# Altium schematic symbol library LATTICEPLDS_Library.SchLib: 291 symbols (part 5 of 32) (continued)
## LCMXO3L-640-MG121
designator U?
SWAP_INFO: (S1+S2+S3+S4+S5); SPLIT_INST: TRUE
part A pins: A2 PT17A (io), A3 PT16A (io), A4 PT15A (io), A5 PT12C/SCL_PCLK0_0 (io), A6 PT12B/PCLKC0_1 (io), A7 PT11A (io), A8 PT10D/TDI (io), A9 PT10A (io), A10 PT9A (io), B2 PT17B (io), B3 PT16B (io), B4 PT15B (io), B5 PT12D/SDA/PCLKC0_O (io), B6 PT12A/PCLKTO_1 (io), B7 PT11B (io), B8 PT10B (io), B9 PT9B (io), C3 PT17C/INITN (io), C4 PT15D/PROGRAMN (io), C5 PT15C/JTAGENB (io), C6 PT11D/TMS (io), C7 PT11C/TCL (io), C8 PT9C (io), D4 PT17D/DONE (io), D6 VCCIO0 (power), D7 PT10C/TDO (io)
part B pins: B1 PR2C (io), C1 PR2D (io), C2 PR2A (io), D1 PR3B (io), D2 PR3A (io), D3 PR2B (io), E1 PR4D (io), E2 PR4C (io), E3 PR4B (io), E4 PR4A (io), F1 PR5D/PCLKC1_0 (io), F2 PR5C/PCLKT1_0 (io), F3 PR5A (io), F4 PR5B (io), G1 PR8A (io), G2 PR8B (io), G3 PR8C (io), G4 PR8D (io), H1 PR9A (io), H2 PR9B (io), H3 PR9C (io), H4 PR9D (io), H5 VCCIO1 (power), J1 PR10A (io), J2 PR10C (io), J3 PR10D (io), K1 PR10B (io)
part C pins: H6 VCCIO2 (power), H7 PB6D/SO/SPISO (io), H9 PB4A (io), J4 PB18D (io), J5 PB18C (io), J6 PB15C (io), J7 PB11D (io), J8 PB6C/MCLK/CCLK (io), J9 PB4B (io), K2 PB20D/SI/SISPI (io), K3 PB20B (io), K4 PB18B (io), K5 PB15B (io), K6 PB11B/PCLKC2_1 (io), K7 PB9B/PCLKC2_0 (io), K8 PB9C (io), K9 PB6A (io), K10 PB4C/CSSPIN (io), L2 PB20C/SN (io), L3 PB20A (io), L4 PB18A (io), L5 PB15A (io), L6 PB11A/PCLKT2_1 (io), L7 PB9A/PCLKT2_0 (io), L8 PB9D (io), L9 PB6B (io), L10 PB4D (io)
part D pins: B10 PL2C/L_GPLLT_IN (io), B11 PL2D/L_GPLLC_IN (io), C9 PL2A/L_GPLLT_FB (io), C10 PL3A/PCLKT3_2 (io), C11 PL3B/PCLKC3_2 (io), D8 VCCIO3 (power), D9 PL3C (io), D10 PL4A (io), D11 PL4B (io), E8 PL2B/L_GPLLC_FB (io), E9 PL3D (io), E10 PL4C (io), E11 PL4D (io), F8 VCCIO3 (power), F9 PL5C (io), F10 PL5B/PCLKC3_1 (io), F11 PL5A/PCLKT3_1 (io), G8 PL8D (io), G9 PL8C (io), G10 PL8B (io), G11 PL8A (io), H8 VCCIO3 (power), H10 PL9B/PCLKC3_0 (io), H11 PL9A/PCLKT3_0 (io), J10 PL10D (io), J11 PL10A (io), K11 PL10C (io)
part E pins: A1 GND (power), A11 GND (power), D5 VCC (power), E5 VCC (power), E6 GND (power), E7 GND (power), F5 GND (power), F6 GND (power), F7 VCC (power), G5 GND (power), G6 GND (power), G7 VCC (power), L1 GND (power), L11 GND (power)
part A text: BANK0
part B text: BANK1
part C text: BANK2
part D text: BANK3

## LCMXO3L-1300-MG121
designator U?
SWAP_INFO: (S1+S2+S3+S4+S5); SPLIT_INST: TRUE
part A pins: A2 PT17A (io), A3 PT16A (io), A4 PT15A (io), A5 PT12C/SCL/PCLKTO_0 (io), A6 PT12B/PCLKC0_1 (io), A7 PT11A (io), A8 PT10D/TDI (io), A9 PT10A (io), A10 PT9A (io), B2 PT17B (io), B3 PT16B (io), B4 PT15B (io), B5 PT12D/SDA/PCLKC0_0 (io), B6 PT12A/PCLKTO_1 (io), B7 PT11B (io), B8 PT10B (io), B9 PT9B (io), C3 PT17C/INITN (io), C4 PT15D/PROGRAMN (io), C5 PT15C/JTAGENB (io), C6 PT11D/TMS (io), C7 PT11C/TCK (io), C8 PT9C (io), D4 PT17D/DONE (io), D6 VCCIO0 (power), D7 PT10C/TDO (io)
part B pins: B1 PR2C (io), C1 PR2D (io), C2 PR2A (io), D1 PR3B (io), D2 PR3A (io), D3 PR2B (io), E1 PR4D (io), E2 PR4C (io), E3 PR4B (io), E4 PR4A (io), F1 PR5D/PCLKC1_0 (io), F2 PR5C/PCLKT1_0 (io), F3 PR5A (io), F4 PR5B (io), G1 PR8A (io), G2 PR8B (io), G3 PR8C (io), G4 PR8D (io), H1 PR9A (io), H2 PR9B (io), H3 PR9C (io), H4 PR9D (io), H5 VCCIO1 (power), J1 PR10A (io), J2 PR10C (io), J3 PR10D (io), K1 PR10B (io)
part C pins: H6 VCCIO2 (power), H7 PB6D/SO/SPISO (io), H9 PB4A (io), J4 PB18D (io), J5 PB18C (io), J6 PB15C (io), J7 PB11D (io), J8 PB6C/MCLK/CCLK (io), J9 PB4B (io), K2 PB20D/SI/SISPI (io), K3 PB20B (io), K4 PB18B (io), K5 PB15B (io), K6 PB11B/PCLKC2_1 (io), K7 PB9B/PCLKC2_0 (io), K8 PB9C (io), K9 PB6A (io), K10 PB4C/CSSPIN (io), L2 PB20C/SN (io), L3 PB20A (io), L4 PB18A (io), L5 PB15A (io), L6 PB11A/PCLKT2_1 (io), L7 PB9A/PCLKT2_0 (io), L8 PB9D (io), L9 PB6B (io), L10 PB4D (io)
part D pins: B10 PL2C/L_GPLLT_IN (io), B11 PL2D/L_GPLLC_IN (io), C9 PL2A/L_GPLLT_FB (io), C10 PL3A/PCLKT3_2 (io), C11 PL3B/PCLKC3_2 (io), D8 VCCIO3 (power), D9 PL3C (io), D10 PL4A (io), D11 PL4B (io), E8 PL2B/L_GPLLC_FB (io), E9 PL3D (io), E10 PL4C (io), E11 PL4D (io), F8 VCCIO3 (power), F9 PL5C (io), F10 PL5B/PCLKC3_1 (io), F11 PL5A/PCLKT3_1 (io), G8 PL8D (io), G9 PL8C (io), G10 PL8B (io), G11 PL8A (io), H8 VCCIO3 (power), H10 PL9B/PCLKC3_0 (io), H11 PL9A/PCLKT3_0 (io), J10 PL10D (io), J11 PL10A (io), K11 PL10C (io)
part E pins: A1 GND (power), A11 GND (power), D5 VCC (power), E5 VCC (power), E6 GND (power), E7 GND (power), F5 GND (power), F6 GND (power), F7 VCC (power), G5 GND (power), G6 GND (power), G7 VCC (power), L1 GND (power), L11 GND (power)
part A text: BANK0
part B text: BANK1
part C text: BANK2
part D text: BANK3

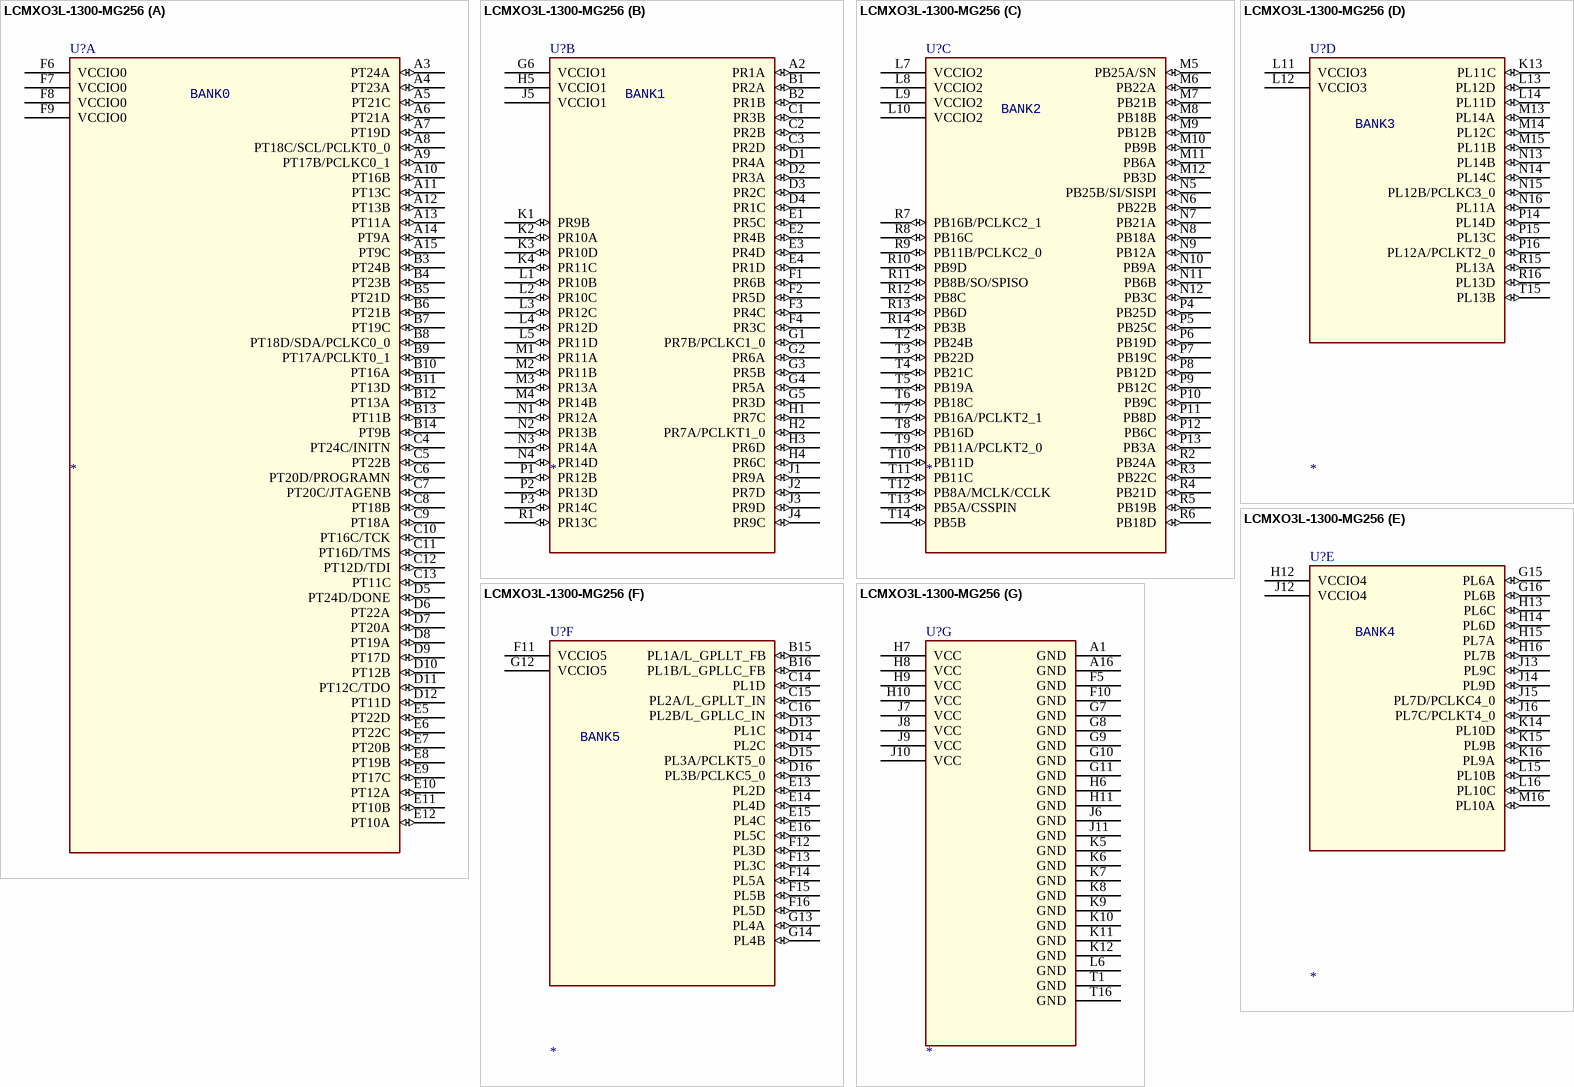
[diagram p52: symbol LCMXO3L-1300-MG256]

## LCMXO3L-1300-MG256
designator U?
SWAP_INFO: (S1+S2+S3+S4+S5+S6+S7); SPLIT_INST: TRUE
part A pins: A3 PT24A (io), A4 PT23A (io), A5 PT21C (io), A6 PT21A (io), A7 PT19D (io), A8 PT18C/SCL/PCLKT0_0 (io), A9 PT17B/PCLKC0_1 (io), A10 PT16B (io), A11 PT13C (io), A12 PT13B (io), A13 PT11A (io), A14 PT9A (io), A15 PT9C (io), B3 PT24B (io), B4 PT23B (io), B5 PT21D (io), B6 PT21B (io), B7 PT19C (io), B8 PT18D/SDA/PCLKC0_0 (io), B9 PT17A/PCLKT0_1 (io), B10 PT16A (io), B11 PT13D (io), B12 PT13A (io), B13 PT11B (io), B14 PT9B (io), C4 PT24C/INITN (io), C5 PT22B (io), C6 PT20D/PROGRAMN (io), C7 PT20C/JTAGENB (io), C8 PT18B (io), C9 PT18A (io), C10 PT16C/TCK (io), C11 PT16D/TMS (io), C12 PT12D/TDI (io), C13 PT11C (io), D5 PT24D/DONE (io), D6 PT22A (io), D7 PT20A (io), D8 PT19A (io), D9 PT17D (io), D10 PT12B (io), D11 PT12C/TDO (io), D12 PT11D (io), E5 PT22D (io), E6 PT22C (io), E7 PT20B (io), E8 PT19B (io), E9 PT17C (io), E10 PT12A (io), E11 PT10B (io), E12 PT10A (io), F6 VCCIO0 (power), F7 VCCIO0 (power), F8 VCCIO0 (power), F9 VCCIO0 (power)
part B pins: A2 PR1A (io), B1 PR2A (io), B2 PR1B (io), C1 PR3B (io), C2 PR2B (io), C3 PR2D (io), D1 PR4A (io), D2 PR3A (io), D3 PR2C (io), D4 PR1C (io), E1 PR5C (io), E2 PR4B (io), E3 PR4D (io), E4 PR1D (io), F1 PR6B (io), F2 PR5D (io), F3 PR4C (io), F4 PR3C (io), G1 PR7B/PCLKC1_0 (io), G2 PR6A (io), G3 PR5B (io), G4 PR5A (io), G5 PR3D (io), G6 VCCIO1 (power), H1 PR7C (io), H2 PR7A/PCLKT1_0 (io), H3 PR6D (io), H4 PR6C (io), H5 VCCIO1 (power), J1 PR9A (io), J2 PR7D (io), J3 PR9D (io), J4 PR9C (io), J5 VCCIO1 (power), K1 PR9B (io), K2 PR10A (io), K3 PR10D (io), K4 PR11C (io), L1 PR10B (io), L2 PR10C (io), L3 PR12C (io), L4 PR12D (io), L5 PR11D (io), M1 PR11A (io), M2 PR11B (io), M3 PR13A (io), M4 PR14B (io), N1 PR12A (io), N2 PR13B (io), N3 PR14A (io), N4 PR14D (io), P1 PR12B (io), P2 PR13D (io), P3 PR14C (io), R1 PR13C (io)
part C pins: L7 VCCIO2 (power), L8 VCCIO2 (power), L9 VCCIO2 (power), L10 VCCIO2 (power), M5 PB25A/SN (io), M6 PB22A (io), M7 PB21B (io), M8 PB18B (io), M9 PB12B (io), M10 PB9B (io), M11 PB6A (io), M12 PB3D (io), N5 PB25B/SI/SISPI (io), N6 PB22B (io), N7 PB21A (io), N8 PB18A (io), N9 PB12A (io), N10 PB9A (io), N11 PB6B (io), N12 PB3C (io), P4 PB25D (io), P5 PB25C (io), P6 PB19D (io), P7 PB19C (io), P8 PB12D (io), P9 PB12C (io), P10 PB9C (io), P11 PB8D (io), P12 PB6C (io), P13 PB3A (io), R2 PB24A (io), R3 PB22C (io), R4 PB21D (io), R5 PB19B (io), R6 PB18D (io), R7 PB16B/PCLKC2_1 (io), R8 PB16C (io), R9 PB11B/PCLKC2_0 (io), R10 PB9D (io), R11 PB8B/SO/SPISO (io), R12 PB8C (io), R13 PB6D (io), R14 PB3B (io), T2 PB24B (io), T3 PB22D (io), T4 PB21C (io), T5 PB19A (io), T6 PB18C (io), T7 PB16A/PCLKT2_1 (io), T8 PB16D (io), T9 PB11A/PCLKT2_0 (io), T10 PB11D (io), T11 PB11C (io), T12 PB8A/MCLK/CCLK (io), T13 PB5A/CSSPIN (io), T14 PB5B (io)
part D pins: K13 PL11C (io), L11 VCCIO3 (power), L12 VCCIO3 (power), L13 PL12D (io), L14 PL11D (io), M13 PL14A (io), M14 PL12C (io), M15 PL11B (io), N13 PL14B (io), N14 PL14C (io), N15 PL12B/PCLKC3_0 (io), N16 PL11A (io), P14 PL14D (io), P15 PL13C (io), P16 PL12A/PCLKT2_0 (io), R15 PL13A (io), R16 PL13D (io), T15 PL13B (io)
part E pins: G15 PL6A (io), G16 PL6B (io), H12 VCCIO4 (power), H13 PL6C (io), H14 PL6D (io), H15 PL7A (io), H16 PL7B (io), J12 VCCIO4 (power), J13 PL9C (io), J14 PL9D (io), J15 PL7D/PCLKC4_0 (io), J16 PL7C/PCLKT4_0 (io), K14 PL10D (io), K15 PL9B (io), K16 PL9A (io), L15 PL10B (io), L16 PL10C (io), M16 PL10A (io)
part F pins: B15 PL1A/L_GPLLT_FB (io), B16 PL1B/L_GPLLC_FB (io), C14 PL1D (io), C15 PL2A/L_GPLLT_IN (io), C16 PL2B/L_GPLLC_IN (io), D13 PL1C (io), D14 PL2C (io), D15 PL3A/PCLKT5_0 (io), D16 PL3B/PCLKC5_0 (io), E13 PL2D (io), E14 PL4D (io), E15 PL4C (io), E16 PL5C (io), F11 VCCIO5 (power), F12 PL3D (io), F13 PL3C (io), F14 PL5A (io), F15 PL5B (io), F16 PL5D (io), G12 VCCIO5 (power), G13 PL4A (io), G14 PL4B (io)
part G pins: A1 GND (power), A16 GND (power), F5 GND (power), F10 GND (power), G7 GND (power), G8 GND (power), G9 GND (power), G10 GND (power), G11 GND (power), H6 GND (power), H7 VCC (power), H8 VCC (power), H9 VCC (power), H10 VCC (power), H11 GND (power), J6 GND (power), J7 VCC (power), J8 VCC (power), J9 VCC (power), J10 VCC (power), J11 GND (power), K5 GND (power), K6 GND (power), K7 GND (power), K8 GND (power), K9 GND (power), K10 GND (power), K11 GND (power), K12 GND (power), L6 GND (power), T1 GND (power), T16 GND (power)
part A text: BANK0
part B text: BANK1
part C text: BANK2
part D text: BANK3
part E text: BANK4
part F text: BANK5

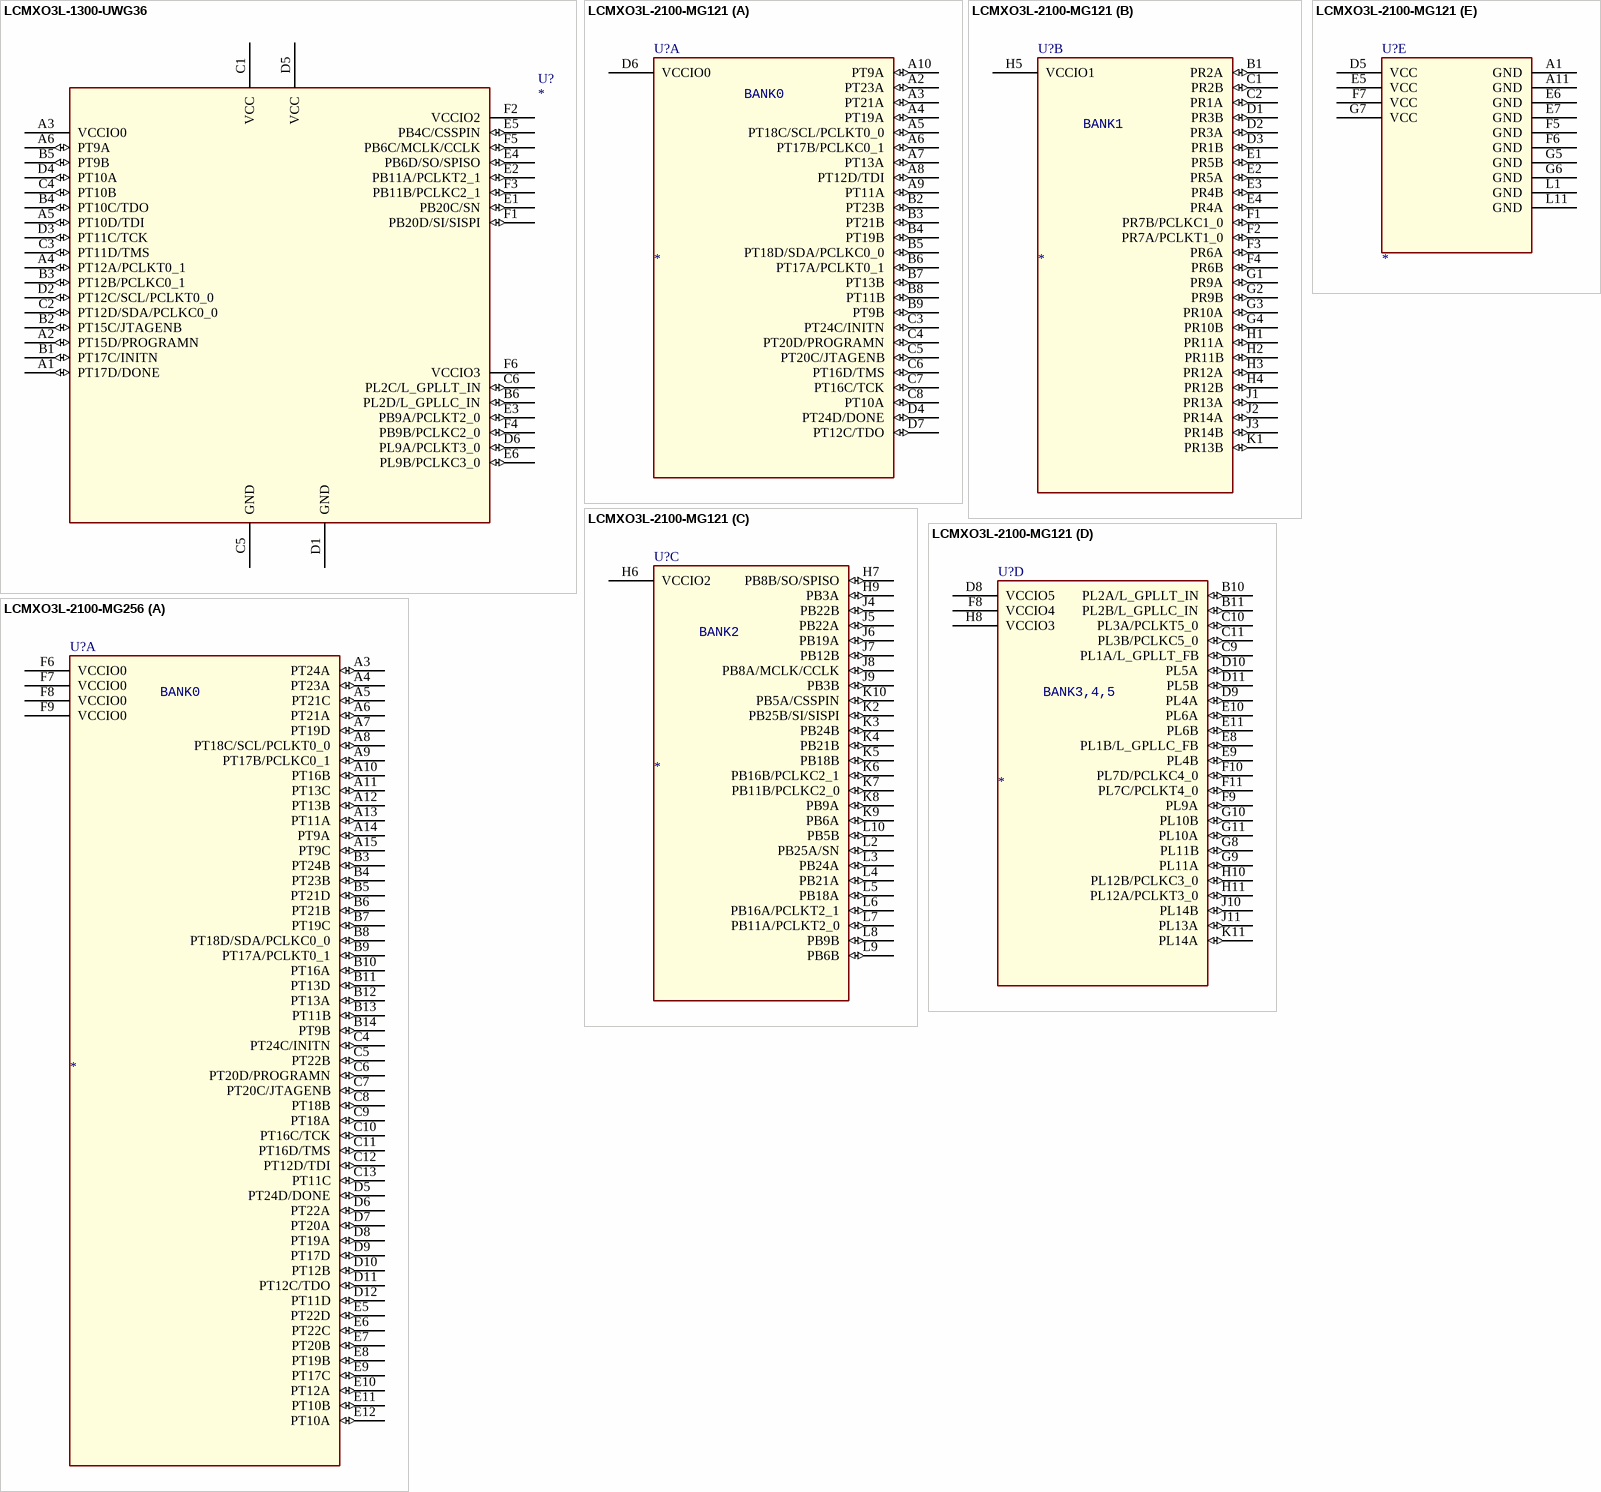
[diagram p53: symbols LCMXO3L-1300-UWG36 to LCMXO3L-2100-MG256]

## LCMXO3L-1300-UWG36
designator U?
pins: A1 PT17D/DONE (io), A2 PT15D/PROGRAMN (io), A3 VCCIO0 (power), A4 PT12A/PCLKT0_1 (io), A5 PT10D/TDI (io), A6 PT9A (io), B1 PT17C/INITN (io), B2 PT15C/JTAGENB (io), B3 PT12B/PCLKC0_1 (io), B4 PT10C/TDO (io), B5 PT9B (io), B6 PL2D/L_GPLLC_IN (io), C1 VCC (power), C2 PT12D/SDA/PCLKC0_0 (io), C3 PT11D/TMS (io), C4 PT10B (io), C5 GND (power), C6 PL2C/L_GPLLT_IN (io), D1 GND (power), D2 PT12C/SCL/PCLKT0_0 (io), D3 PT11C/TCK (io), D4 PT10A (io), D5 VCC (power), D6 PL9A/PCLKT3_0 (io), E1 PB20C/SN (io), E2 PB11A/PCLKT2_1 (io), E3 PB9A/PCLKT2_0 (io), E4 PB6D/SO/SPISO (io), E5 PB4C/CSSPIN (io), E6 PL9B/PCLKC3_0 (io), F1 PB20D/SI/SISPI (io), F2 VCCIO2 (power), F3 PB11B/PCLKC2_1 (io), F4 PB9B/PCLKC2_0 (io), F5 PB6C/MCLK/CCLK (io), F6 VCCIO3 (power)

## LCMXO3L-2100-MG121
designator U?
SWAP_INFO: (S1+S2+S3+S4+S5); SPLIT_INST: TRUE
part A pins: A2 PT23A (io), A3 PT21A (io), A4 PT19A (io), A5 PT18C/SCL/PCLKT0_0 (io), A6 PT17B/PCLKC0_1 (io), A7 PT13A (io), A8 PT12D/TDI (io), A9 PT11A (io), A10 PT9A (io), B2 PT23B (io), B3 PT21B (io), B4 PT19B (io), B5 PT18D/SDA/PCLKC0_0 (io), B6 PT17A/PCLKT0_1 (io), B7 PT13B (io), B8 PT11B (io), B9 PT9B (io), C3 PT24C/INITN (io), C4 PT20D/PROGRAMN (io), C5 PT20C/JTAGENB (io), C6 PT16D/TMS (io), C7 PT16C/TCK (io), C8 PT10A (io), D4 PT24D/DONE (io), D6 VCCIO0 (power), D7 PT12C/TDO (io)
part B pins: B1 PR2A (io), C1 PR2B (io), C2 PR1A (io), D1 PR3B (io), D2 PR3A (io), D3 PR1B (io), E1 PR5B (io), E2 PR5A (io), E3 PR4B (io), E4 PR4A (io), F1 PR7B/PCLKC1_0 (io), F2 PR7A/PCLKT1_0 (io), F3 PR6A (io), F4 PR6B (io), G1 PR9A (io), G2 PR9B (io), G3 PR10A (io), G4 PR10B (io), H1 PR11A (io), H2 PR11B (io), H3 PR12A (io), H4 PR12B (io), H5 VCCIO1 (power), J1 PR13A (io), J2 PR14A (io), J3 PR14B (io), K1 PR13B (io)
part C pins: H6 VCCIO2 (power), H7 PB8B/SO/SPISO (io), H9 PB3A (io), J4 PB22B (io), J5 PB22A (io), J6 PB19A (io), J7 PB12B (io), J8 PB8A/MCLK/CCLK (io), J9 PB3B (io), K2 PB25B/SI/SISPI (io), K3 PB24B (io), K4 PB21B (io), K5 PB18B (io), K6 PB16B/PCLKC2_1 (io), K7 PB11B/PCLKC2_0 (io), K8 PB9A (io), K9 PB6A (io), K10 PB5A/CSSPIN (io), L2 PB25A/SN (io), L3 PB24A (io), L4 PB21A (io), L5 PB18A (io), L6 PB16A/PCLKT2_1 (io), L7 PB11A/PCLKT2_0 (io), L8 PB9B (io), L9 PB6B (io), L10 PB5B (io)
part D pins: B10 PL2A/L_GPLLT_IN (io), B11 PL2B/L_GPLLC_IN (io), C9 PL1A/L_GPLLT_FB (io), C10 PL3A/PCLKT5_0 (io), C11 PL3B/PCLKC5_0 (io), D8 VCCIO5 (power), D9 PL4A (io), D10 PL5A (io), D11 PL5B (io), E8 PL1B/L_GPLLC_FB (io), E9 PL4B (io), E10 PL6A (io), E11 PL6B (io), F8 VCCIO4 (power), F9 PL9A (io), F10 PL7D/PCLKC4_0 (io), F11 PL7C/PCLKT4_0 (io), G8 PL11B (io), G9 PL11A (io), G10 PL10B (io), G11 PL10A (io), H8 VCCIO3 (power), H10 PL12B/PCLKC3_0 (io), H11 PL12A/PCLKT3_0 (io), J10 PL14B (io), J11 PL13A (io), K11 PL14A (io)
part E pins: A1 GND (power), A11 GND (power), D5 VCC (power), E5 VCC (power), E6 GND (power), E7 GND (power), F5 GND (power), F6 GND (power), F7 VCC (power), G5 GND (power), G6 GND (power), G7 VCC (power), L1 GND (power), L11 GND (power)
part A text: BANK0
part B text: BANK1
part C text: BANK2
part D text: BANK3,4,5

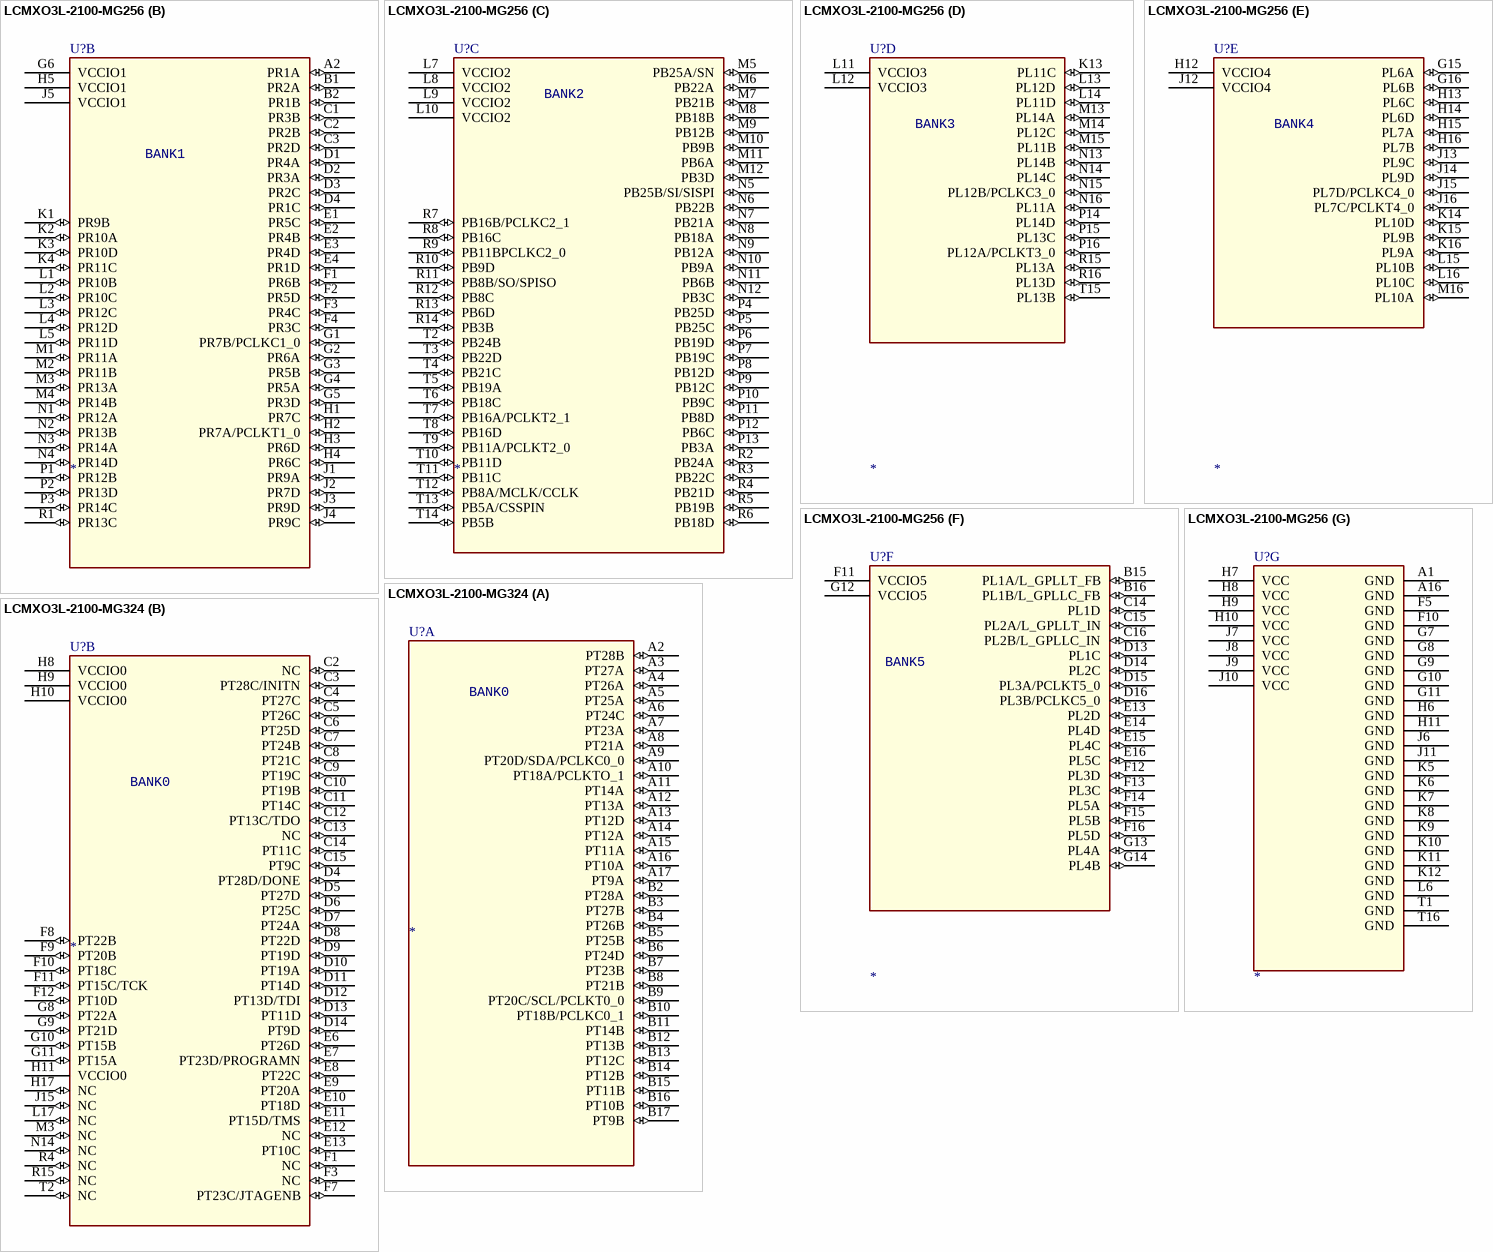
[diagram p54: symbols LCMXO3L-2100-MG256 to LCMXO3L-2100-MG324]

## LCMXO3L-2100-MG256
designator U?
SPLIT_INST: TRUE; SWAP_INFO: (S1+S2+S3+S4+S5+S6+S7)
part A pins: A3 PT24A (io), A4 PT23A (io), A5 PT21C (io), A6 PT21A (io), A7 PT19D (io), A8 PT18C/SCL/PCLKT0_0 (io), A9 PT17B/PCLKC0_1 (io), A10 PT16B (io), A11 PT13C (io), A12 PT13B (io), A13 PT11A (io), A14 PT9A (io), A15 PT9C (io), B3 PT24B (io), B4 PT23B (io), B5 PT21D (io), B6 PT21B (io), B7 PT19C (io), B8 PT18D/SDA/PCLKC0_0 (io), B9 PT17A/PCLKT0_1 (io), B10 PT16A (io), B11 PT13D (io), B12 PT13A (io), B13 PT11B (io), B14 PT9B (io), C4 PT24C/INITN (io), C5 PT22B (io), C6 PT20D/PROGRAMN (io), C7 PT20C/JTAGENB (io), C8 PT18B (io), C9 PT18A (io), C10 PT16C/TCK (io), C11 PT16D/TMS (io), C12 PT12D/TDI (io), C13 PT11C (io), D5 PT24D/DONE (io), D6 PT22A (io), D7 PT20A (io), D8 PT19A (io), D9 PT17D (io), D10 PT12B (io), D11 PT12C/TDO (io), D12 PT11D (io), E5 PT22D (io), E6 PT22C (io), E7 PT20B (io), E8 PT19B (io), E9 PT17C (io), E10 PT12A (io), E11 PT10B (io), E12 PT10A (io), F6 VCCIO0 (power), F7 VCCIO0 (power), F8 VCCIO0 (power), F9 VCCIO0 (power)
part B pins: A2 PR1A (io), B1 PR2A (io), B2 PR1B (io), C1 PR3B (io), C2 PR2B (io), C3 PR2D (io), D1 PR4A (io), D2 PR3A (io), D3 PR2C (io), D4 PR1C (io), E1 PR5C (io), E2 PR4B (io), E3 PR4D (io), E4 PR1D (io), F1 PR6B (io), F2 PR5D (io), F3 PR4C (io), F4 PR3C (io), G1 PR7B/PCLKC1_0 (io), G2 PR6A (io), G3 PR5B (io), G4 PR5A (io), G5 PR3D (io), G6 VCCIO1 (power), H1 PR7C (io), H2 PR7A/PCLKT1_0 (io), H3 PR6D (io), H4 PR6C (io), H5 VCCIO1 (power), J1 PR9A (io), J2 PR7D (io), J3 PR9D (io), J4 PR9C (io), J5 VCCIO1 (power), K1 PR9B (io), K2 PR10A (io), K3 PR10D (io), K4 PR11C (io), L1 PR10B (io), L2 PR10C (io), L3 PR12C (io), L4 PR12D (io), L5 PR11D (io), M1 PR11A (io), M2 PR11B (io), M3 PR13A (io), M4 PR14B (io), N1 PR12A (io), N2 PR13B (io), N3 PR14A (io), N4 PR14D (io), P1 PR12B (io), P2 PR13D (io), P3 PR14C (io), R1 PR13C (io)
part C pins: L7 VCCIO2 (power), L8 VCCIO2 (power), L9 VCCIO2 (power), L10 VCCIO2 (power), M5 PB25A/SN (io), M6 PB22A (io), M7 PB21B (io), M8 PB18B (io), M9 PB12B (io), M10 PB9B (io), M11 PB6A (io), M12 PB3D (io), N5 PB25B/SI/SISPI (io), N6 PB22B (io), N7 PB21A (io), N8 PB18A (io), N9 PB12A (io), N10 PB9A (io), N11 PB6B (io), N12 PB3C (io), P4 PB25D (io), P5 PB25C (io), P6 PB19D (io), P7 PB19C (io), P8 PB12D (io), P9 PB12C (io), P10 PB9C (io), P11 PB8D (io), P12 PB6C (io), P13 PB3A (io), R2 PB24A (io), R3 PB22C (io), R4 PB21D (io), R5 PB19B (io), R6 PB18D (io), R7 PB16B/PCLKC2_1 (io), R8 PB16C (io), R9 PB11BPCLKC2_0 (io), R10 PB9D (io), R11 PB8B/SO/SPISO (io), R12 PB8C (io), R13 PB6D (io), R14 PB3B (io), T2 PB24B (io), T3 PB22D (io), T4 PB21C (io), T5 PB19A (io), T6 PB18C (io), T7 PB16A/PCLKT2_1 (io), T8 PB16D (io), T9 PB11A/PCLKT2_0 (io), T10 PB11D (io), T11 PB11C (io), T12 PB8A/MCLK/CCLK (io), T13 PB5A/CSSPIN (io), T14 PB5B (io)
part D pins: K13 PL11C (io), L11 VCCIO3 (power), L12 VCCIO3 (power), L13 PL12D (io), L14 PL11D (io), M13 PL14A (io), M14 PL12C (io), M15 PL11B (io), N13 PL14B (io), N14 PL14C (io), N15 PL12B/PCLKC3_0 (io), N16 PL11A (io), P14 PL14D (io), P15 PL13C (io), P16 PL12A/PCLKT3_0 (io), R15 PL13A (io), R16 PL13D (io), T15 PL13B (io)
part E pins: G15 PL6A (io), G16 PL6B (io), H12 VCCIO4 (power), H13 PL6C (io), H14 PL6D (io), H15 PL7A (io), H16 PL7B (io), J12 VCCIO4 (power), J13 PL9C (io), J14 PL9D (io), J15 PL7D/PCLKC4_0 (io), J16 PL7C/PCLKT4_0 (io), K14 PL10D (io), K15 PL9B (io), K16 PL9A (io), L15 PL10B (io), L16 PL10C (io), M16 PL10A (io)
part F pins: B15 PL1A/L_GPLLT_FB (io), B16 PL1B/L_GPLLC_FB (io), C14 PL1D (io), C15 PL2A/L_GPLLT_IN (io), C16 PL2B/L_GPLLC_IN (io), D13 PL1C (io), D14 PL2C (io), D15 PL3A/PCLKT5_0 (io), D16 PL3B/PCLKC5_0 (io), E13 PL2D (io), E14 PL4D (io), E15 PL4C (io), E16 PL5C (io), F11 VCCIO5 (power), F12 PL3D (io), F13 PL3C (io), F14 PL5A (io), F15 PL5B (io), F16 PL5D (io), G12 VCCIO5 (power), G13 PL4A (io), G14 PL4B (io)
part G pins: A1 GND (power), A16 GND (power), F5 GND (power), F10 GND (power), G7 GND (power), G8 GND (power), G9 GND (power), G10 GND (power), G11 GND (power), H6 GND (power), H7 VCC (power), H8 VCC (power), H9 VCC (power), H10 VCC (power), H11 GND (power), J6 GND (power), J7 VCC (power), J8 VCC (power), J9 VCC (power), J10 VCC (power), J11 GND (power), K5 GND (power), K6 GND (power), K7 GND (power), K8 GND (power), K9 GND (power), K10 GND (power), K11 GND (power), K12 GND (power), L6 GND (power), T1 GND (power), T16 GND (power)
part A text: BANK0
part B text: BANK1
part C text: BANK2
part D text: BANK3
part E text: BANK4
part F text: BANK5

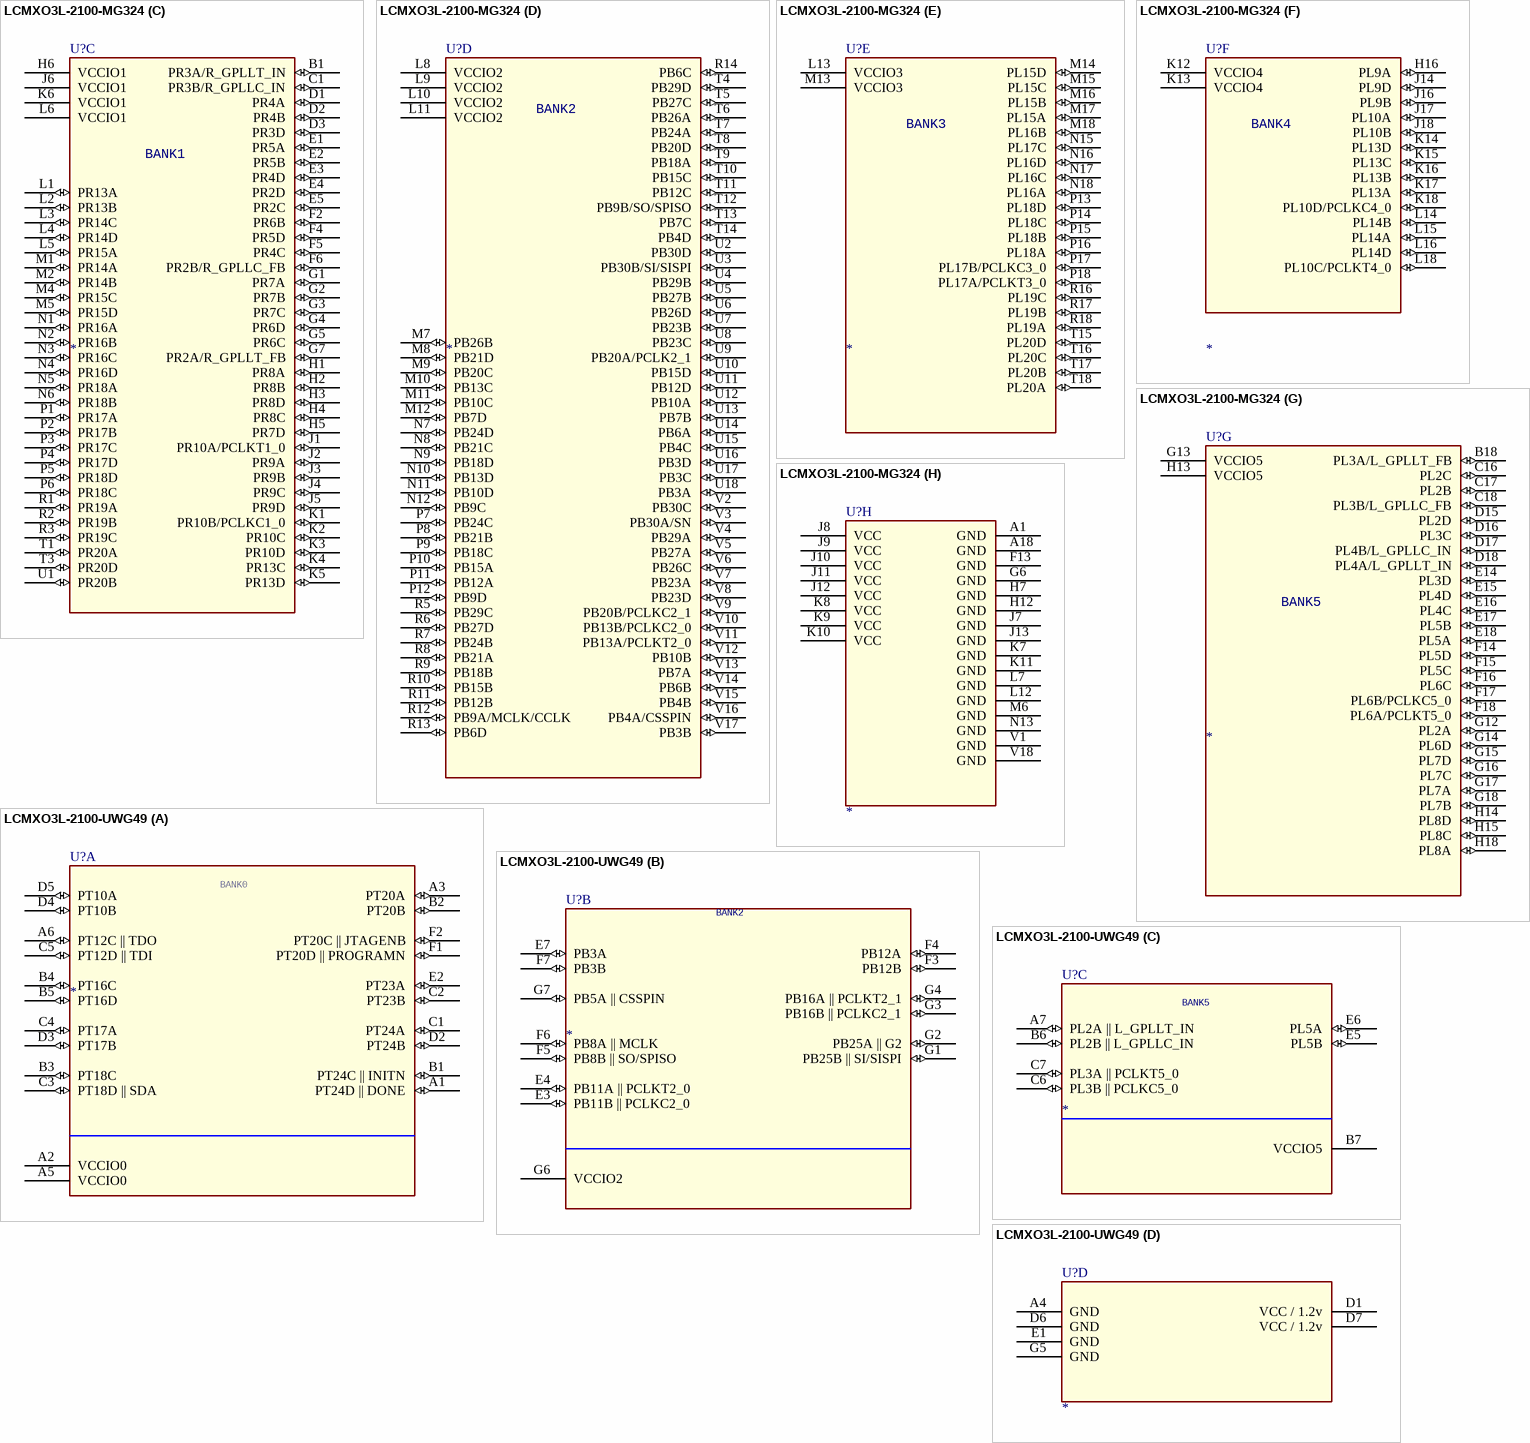
[diagram p55: symbols LCMXO3L-2100-MG324 to LCMXO3L-2100-UWG49]